# Altium footprint library Hydra_Ref_pcb.PcbLib: 353 footprints (part 10 of 23)
Each footprint in its own frame and in the unit in brackets; x right, y up, seen from the top. Pads: shape width x height; smd on the part's side, far side on the other; paste and mask are expansions set on the pad; w line width, h text height; cw(c..) or ccw(c..) is an arc to the next point about the centre after c.
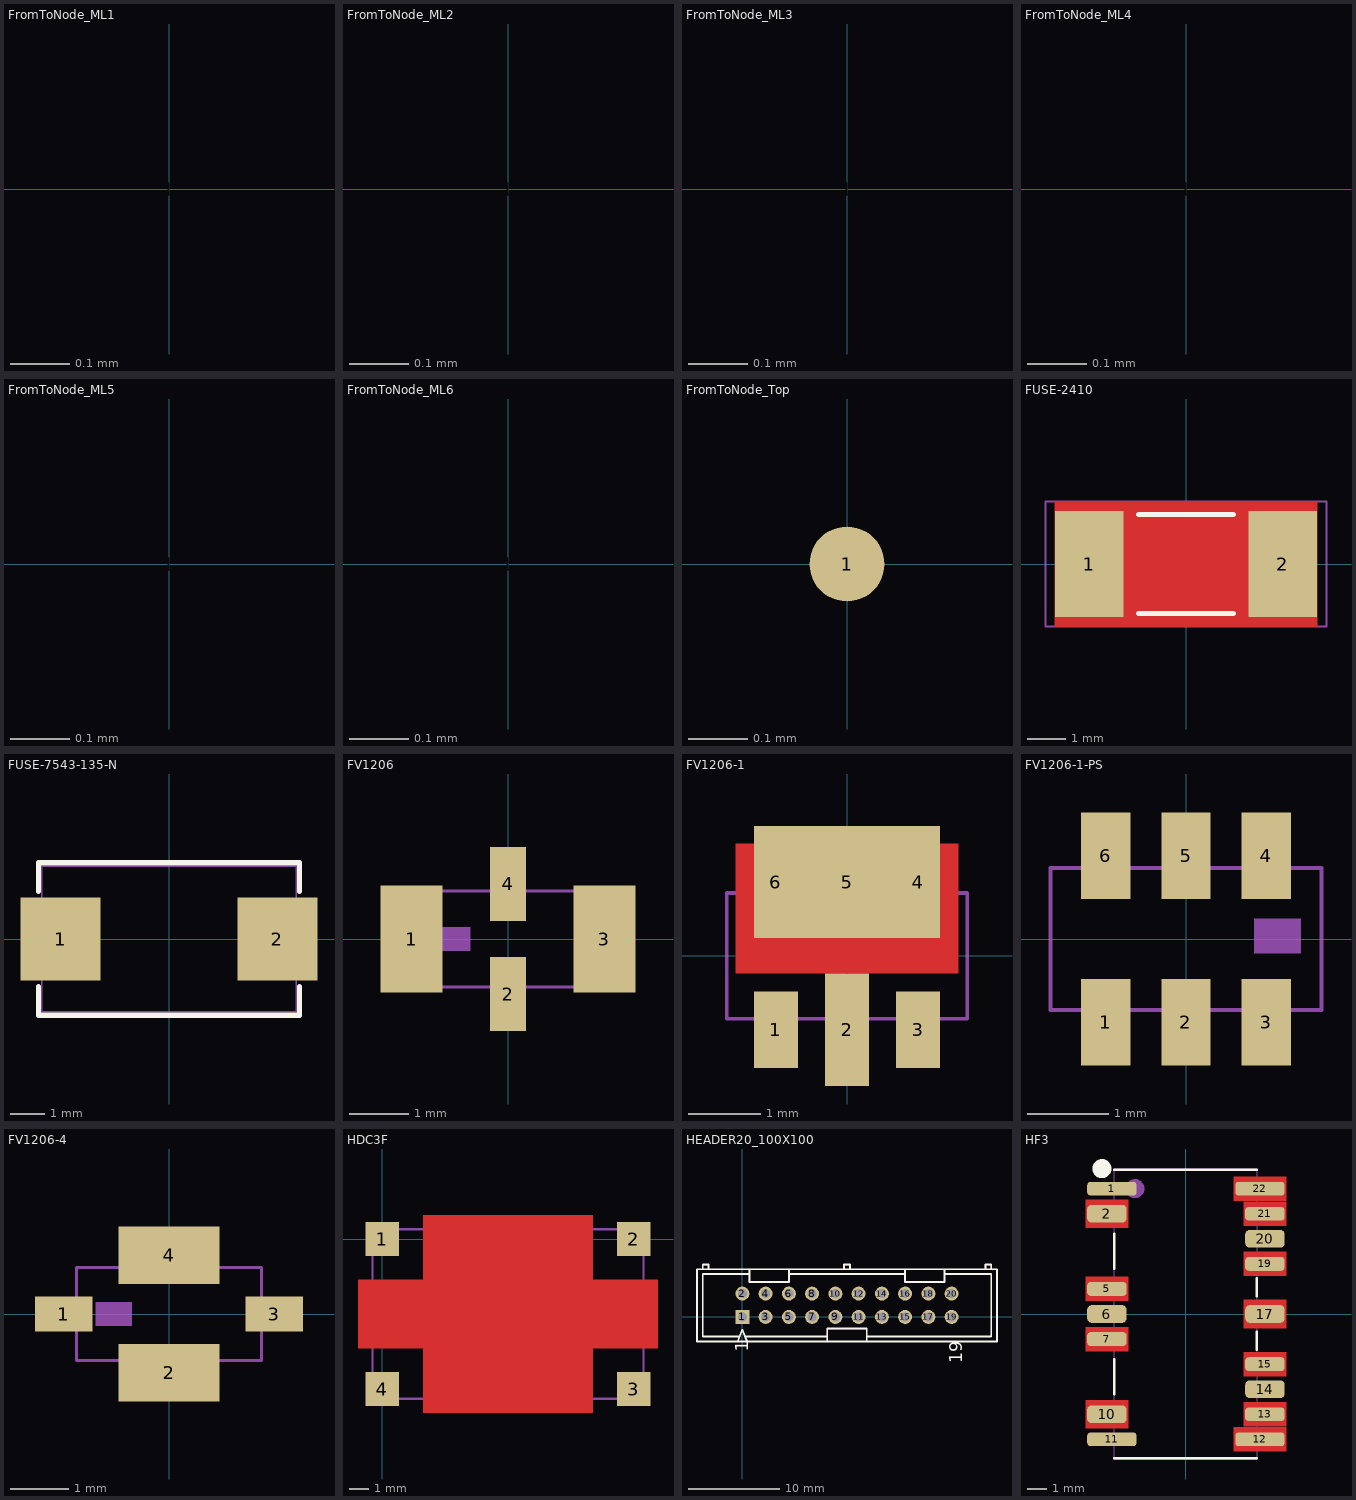
[diagram p9: the footprints below, top view; thin cyan lines are the x and y axes]

## FromToNode_ML1 [mil]
pads (1):
  round 5 on Mid1 paste-5 mask-5: 1(0,0)

## FromToNode_ML2 [mil]
pads (1):
  round 5 on Mid3 paste-5 mask-5: 1(0,0)

## FromToNode_ML3 [mil]
pads (1):
  round 5 on Mid2 paste-5 mask-5: 1(0,0)

## FromToNode_ML4 [mil]
pads (1):
  round 5 on Mid4 paste-5 mask-5: 1(0,0)

## FromToNode_ML5 [mil]
pads (1):
  round 5 on Mid5 paste-5 mask-5: 1(0,0)

## FromToNode_ML6 [mil]
pads (1):
  round 5 on Mid6 paste-5 mask-5: 1(0,0)

## FromToNode_Top [mil]
pads (1):
  round 5 smd paste-5 mask-5: 1(0,0)

## FUSE-2410 [mm] "FUSE, Littelfuse SMT 2410, Body 6.10x2.69mm, IPC Medium Density"
height 2.69
pads (2):
  rect 1.8x2.8 smd: 1(-2.55,0) 2(2.55,0)
Top Layer:
  pour cut-out: -3.45,1.65 -3.45,-1.65 3.45,-1.65 3.45,1.65
Top Overlay:
  lines w0.127: -1.25,-1.3 1.25,-1.3 ; -1.25,1.3 1.25,1.3
9 Top Assy:
  lines w0.051: -3.05,-1.345 3.05,-1.345 3.05,1.345 -3.05,1.345 -3.05,-1.345
  text ".Designator" at -2.666,-0.762 h1.52
15 Top Optical Placement:
  lines w0.051: -3.7,-1.65 3.7,-1.65 3.7,1.65 -3.7,1.65 -3.7,-1.65
  lines w0.1: -0.5,0 0.5,0 ; 0,-0.5 0,0.5
3D body: height 2.69, standoff 0, extent 1.6,-1.345 3.05,1.345
3D body: height 2.69, standoff 0, extent -3.05,-1.345 -1.6,1.345
3D body: height 2.69, standoff 0, extent -1.6,-1.345 1.6,1.345

## FUSE-7543-135-N [mm] "7.5L 4.3W 3.11H mm"
height 3.2
pads (2):
  rect 2.35x2.45 smd: 1(-3.2,0) 2(3.2,0)
Top Overlay:
  lines w0.152: -3.85,-1.4 -3.85,-2.25 3.85,-2.25 3.85,-1.4 ; -3.85,1.4 -3.85,2.25 3.85,2.25 3.85,1.4
9 Top Assy:
  lines w0.051: -3.75,-1.15 -2.45,-1.15 -2.45,1.15 -3.75,1.15 ; 3.75,-1.15 2.45,-1.15 2.45,1.15 3.75,1.15 ; -3.75,-2.15 -3.75,2.15 3.75,2.15 3.75,-2.15 -3.75,-2.15
  text ".Designator" at -2.2,-0.6 h1.27
3D body: height 3.2, standoff 0, extent -4.75,-2.5 4.75,2.5

## FV1206 [mil] "FV1206 Mini-Circuits"
height 37
pads (4):
  rect 41x71 smd: 1(-64,0) 3(64,0)
  rect 24x49 smd: 2(0,-36.5) 4(0,36.5)
Top Layer:
  rectangle: -12,-61 12,-12
Top Paste:
  rectangle: -12,-32 12,-12
  rectangle: -12,12 12,32
Top Solder:
  rectangle: -16,-65 16,-8
  rectangle: -16,8 16,65
  pour cut-out: -96,45 -80,45 -80,-45 -96,-45
  pour cut-out: 25,72 -25,72 -25,-72 25,-72
  pour cut-out: 96,45 80,45 80,-45 96,-45
9 Top Assy:
  rectangle: -50,-8 -25,8
  lines w2: -63,-32 63,-32 63,32 -63,32 -63,-32
  text ".Designator" at -16,-8 h18
3D body: height 37, standoff 0, extent -63,-32 63,32

## FV1206-1 [mil] "MINI-CIRCUITS FV1206-1"
height 42
pads (6):
  rect 24x42 smd: 1(-39,-40.5) 3(39,-40.5) 4(39,40.5) 6(-39,40.5)
  rect 24x61.5 smd paste-30 mask-30: 2(0,-40.5)
  rect 102x61.5 smd paste-100 mask-100: 5(0,40.5)
Top Layer:
  pour cut-out: -61,61.6 61,61.6 61,-9.4 -61,-9.4
Top Paste:
  rectangle: -12,19.5 12,61.5
  rectangle: -12,-61.5 12,-19.5
Top Solder:
  rectangle: -16,15.5 16,65.5
  rectangle: -16,-65.5 16,-15.5
  pour cut-out: -62,73 62,73 62,-73 -62,-73
9 Top Assy:
  rectangle: 33,-7 56,10
  lines w2: -66,-34.5 -66,34.5 66,34.5 66,-34.5 -66,-34.5
  text ".Designator" at -56,-6 h18
3D body: height 42, standoff 0.39, extent -66,-34.5 67,34.5

## FV1206-1-PS [mil] "MINI-CIRCUITS FV1206-1 Power Splitter"
height 42
pads (6):
  rect 24x42 smd: 1(-39,-40.5) 2(0,-40.5) 3(39,-40.5) 4(39,40.5) 5(0,40.5) 6(-39,40.5)
Top Solder:
  pour cut-out: -62,73 62,73 62,-73 -62,-73
9 Top Assy:
  rectangle: 33,-7 56,10
  lines w2: -66,-34.5 -66,34.5 66,34.5 66,-34.5 -66,-34.5
  text ".Designator" at -56,-6 h18
3D body: height 42, standoff 0.39, extent -66,-34.5 67,34.5

## FV1206-4 [mil] "FV1206-4 Mini-Circuits"
height 37
pads (4):
  rect 39x24 smd: 1(-71.5,0) 3(71.5,0)
  rect 69x39 smd: 2(0,-40) 4(0,40)
Top Solder:
  pour cut-out: -102,19 -50,71 50,71 102,19 102,-19 50,-71 -50,-71 -102,-19
9 Top Assy:
  rectangle: -50,-8 -25,8
  lines w2: -63,-31.5 63,-31.5 63,31.5 -63,31.5 -63,-31.5
  text ".Designator" at -16,-8 h18
3D body: height 40, standoff 0, extent -63,-31.5 63,31.5

## HDC3F [mil] "HDC3F"
height 75
pads (4):
  rect 70x70 smd: 1(0,0) 2(520,0) 3(520,-310) 4(0,-310)
Top Layer:
  rectangle: -50,-226 570,-84
  rectangle: 84,-360 436,50
9 Top Assy:
  lines w5: -20,-300 cw(c-20,-330) 10,-330 ; -20,-10 ccw(c-20,20) 10,20 ; 510,-330 cw(c540,-330) 540,-300 ; 510,20 ccw(c540,20) 540,-10 ; -20,-330 -20,20 540,20 540,-330 -20,-330
  text ".Designator" at 244,-163 h18

## HEADER20_100X100 [mil] "OLD PART"
pads (20):
  rect 60x60 / inner round 60 / far side round 60 hole 38: 1(0,0)
  round 60 hole 38: 2(0,100) 3(100,0) 4(100,100) 5(200,0) 6(200,100) 7(300,0) 8(300,100) 9(400,0) 10(400,100) 11(500,0) 12(500,100) 13(600,0) 14(600,100) 15(700,0) 16(700,100) 17(800,0) 18(800,100) 19(900,0) 20(900,100)
Top Overlay:
  lines w8: -170,205 -170,225 -145,225 -145,205 ; -20,-105 0,-55 20,-105 ; -15,-85 -170,-85 -170,185 30,185 ; 15,-85 365,-85 ; 30,205 30,150 200,150 200,205 ; 200,185 700,185 ; 365,-105 365,-50 535,-50 535,-105 ; 437.5,205 437.5,225 462.5,225 462.5,205 ; 535,-85 1070,-85 1070,185 870,185 ; 700,205 700,150 870,150 870,205 ; 1045,205 1045,225 1070,225 1070,205 ; -195,-105 -195,205 1095,205 1095,-105 -195,-105
  text "19" at 945,-200 h55
  text "1" at 25,-150 h55
9 Top Assy:
  lines w2: -170,205 -170,225 -145,225 -145,205 ; -20,-105 0,-55 20,-105 ; 30,205 30,150 200,150 200,205 ; 365,-105 365,-50 535,-50 535,-105 ; 437.5,205 437.5,225 462.5,225 462.5,205 ; 700,205 700,150 870,150 870,205 ; 1045,205 1045,225 1070,225 1070,205 ; -195,-105 1095,-105 1095,205 -195,205 -195,-105
  text "19" at 995,-25 h40
  text "20" at 990,80 h40
  text "1" at -50,-5 h40
  text "2" at -50,95 h40
  text ".Designator" at 355,25 h60

## HF3 [mm] "OLD PART SOIC, 8-Leads, Body 4.9x3.9mm, Pitch 1.27mm, IPC Medium Density"
height 1.75
pads (16):
  rrect50% 2.5x0.7 smd: 1(-3.75,6.35) 11(-3.75,-6.35) 12(3.75,-6.35) 22(3.75,6.35)
  rrect50% 2x0.9 smd: 2(-4.004,5.08) 6(-4.004,0) 10(-4.004,-5.08) 14(4.004,-3.81) 17(4.004,0) 20(4.004,3.81)
  rrect50% 2x0.7 smd: 5(-4.004,1.27) 7(-4.004,-1.27) 13(4.004,-5.08) 15(4.004,-2.54) 19(4.004,2.54) 21(4.004,5.08)
Top Layer:
  pour cut-out: 2.413,5.74 2.413,6.96 5.08,6.96 5.08,5.74
  pour cut-out: 2.413,-6.96 2.413,-5.74 5.08,-5.74 5.08,-6.96
  pour cut-out: 2.928,-0.711 2.928,0.711 5.087,0.711 5.087,-0.711
  pour cut-out: -5.08,-5.791 -5.08,-4.369 -2.921,-4.369 -2.921,-5.791
  pour cut-out: -5.08,4.369 -5.08,5.791 -2.921,5.791 -2.921,4.369
  pour cut-out: -5.08,0.66 -5.08,1.88 -2.921,1.88 -2.921,0.66
  pour cut-out: -5.08,-1.88 -5.08,-0.66 -2.921,-0.66 -2.921,-1.88
  pour cut-out: 2.928,-5.69 2.928,-4.47 5.087,-4.47 5.087,-5.69
  pour cut-out: 2.928,-3.15 2.928,-1.93 5.087,-1.93 5.087,-3.15
  pour cut-out: 2.928,1.93 2.928,3.15 5.087,3.15 5.087,1.93
  pour cut-out: 2.928,4.47 2.928,5.69 5.087,5.69 5.087,4.47
Top Overlay:
  circle w0.508: c-4.256,7.366 r0.229
  lines w0.127: -3.62,-7.3 3.589,-7.3 ; -3.62,-4.067 -3.62,-2.289 ; -3.62,2.289 -3.62,4.067 ; -3.62,7.3 3.589,7.3 ; 3.589,-1.805 3.589,-0.889 ; 3.589,0.889 3.589,1.805
9 Top Assy:
  circle w0.508: c-2.582,6.35 r0.229
  lines w0.051: -3.623,-7.366 -3.623,7.366 3.616,7.366 3.616,-4.191 3.616,-7.366 -3.623,-7.366
  text ".Designator" at -2.607,-0.635 h1.52
3D body: height 1.75, standoff 0, extent -3.622,-7.365 3.615,7.365